# Altium integrated library CDxx.IntLib: 163 symbols (continued)
## 4082 (continued)

## 4085
designator U?
footprint DIL14-300
pins on every part: 7 VSS (power) hidden to VSS, 14 VDD (power) hidden to VDD
part A pins: 1 A (in), 2 B (in), 3 OUT (out), 10 INH (in), 12 C (in), 13 D (in)
part B pins: 4 OUT (out), 5 A (in), 6 B (in), 8 C (in), 9 D (in), 11 INH (in)

## 4085A
designator U?
footprint DIL14-300
pins on every part: 7 VSS (power) hidden to VSS, 14 VDD (power) hidden to VDD
part A pins: 1 (in), 2 (in), 3 (out), 10 (in), 12 (in), 13 (in)
part B pins: 4 (out), 5 (in), 6 (in), 8 (in), 9 (in), 11 (in)

## 4086
designator U?
footprint DIL14-300
pins: 1 A (in), 2 B (in), 3 J (out), 5 E (in), 6 F (in), 7 VSS (power) hidden to VSS, 8 G (in), 9 H (in), 10 I/~{E} (in), 11 EN/~{EX} (in), 12 C (in), 13 D (in), 14 VDD (power) hidden to VDD

## 4089
designator U?
footprint DIL16-300a
pins: 1 15 (out), 2 C (in), 3 D (in), 4 S15 (in), 5 OUT (out), 6 OUT (out), 7 INO (out), 8 VSS (power) hidden to VSS, 9 CLK (in), 10 ST (in), 11 INH (in), 12 CAS (in), 13 CL (in), 14 A (in), 15 B (in), 16 VDD (power) hidden to VDD

## 4093
designator U?
Price: 0.25
footprint DIL14-300
pins on every part: 7 VSS (power) hidden to VSS, 14 VDD (power) hidden to VDD
part A pins: 1 I0 (in), 2 I1 (in), 3 O (out)
part B pins: 4 O (out), 5 I0 (in), 6 I1 (in)
part C pins: 8 I0 (in), 9 I1 (in), 10 O (out)
part D pins: 11 O (out), 12 I0 (in), 13 I1 (in)
1 alternate drawing of the same symbol

## 4094
designator U?
footprint DIL16-300a
pins: 1 STR (in), 2 D (in), 3 CLK (in), 4 Q0 (out), 5 Q1 (out), 6 Q2 (out), 7 Q3 (out), 8 VSS (power) hidden to VSS, 9 QS (out), 10 ~{QS} (out), 11 Q7 (out), 12 Q6 (out), 13 Q5 (out), 14 Q4 (out), 15 OE (in), 16 VDD (power) hidden to VDD

## 4095
designator U?
footprint DIL14-300
pins: 2 R (in), 3 J1 (in), 4 J2 (in), 5 J3 (in), 6 ~{Q} (out), 7 VSS (power) hidden to VSS, 8 Q (out), 9 K3 (in), 10 K2 (in), 11 K1 (in), 12 CLK (in), 13 S (in), 14 VDD (power) hidden to VDD

## 4096
designator U?
footprint DIL14-300
pins: 2 R (in), 3 J1 (in), 4 J2 (in), 5 J3 (in), 6 ~{Q} (out), 7 VSS (power) hidden to VSS, 8 Q (out), 9 K3 (in), 10 K2 (in), 11 K1 (in), 12 CLK (in), 13 S (in), 14 VDD (power) hidden to VDD

## 4099
designator U?
footprint DIL16-300a
pins: 1 Q7 (out), 2 RST (in), 3 D (in), 4 WD (in), 5 A0 (in), 6 A1 (in), 7 A2 (in), 8 VSS (power) hidden to VSS, 9 Q0 (out), 10 Q1 (out), 11 Q2 (out), 12 Q3 (out), 13 Q4 (out), 14 Q5 (out), 15 Q6 (out), 16 VDD (power) hidden to VDD

## 4501
designator U?
footprint DIL16-300a
pins: 1 1A (in), 2 1B (in), 3 1C (in), 4 1D (in), 5 2A (in), 6 2B (in), 7 2C (in), 8 VSS (power) hidden to VSS, 9 2D (in), 10 2X (out), 11 E (in), 12 F (in), 13 1X (out), 14 Y (out), 15 ~{Y} (out), 16 VDD (power) hidden to VDD

## 4502
designator U?
footprint DIL16-300a
pins: 1 D3 (in), 2 Q3 (out), 3 D1 (in), 4 OD (in), 5 Q1 (out), 6 D2 (in), 7 Q2 (out), 8 Vss (power) hidden to Vss, 9 Q4 (out), 10 D4 (in), 11 Q5 (out), 12 INH (in), 13 D5 (in), 14 Q6 (out), 15 D6 (in), 16 Vdd (power) hidden to Vdd

## 4503
designator U?
footprint DIL16-300a
pins: 1 DA (in), 2 I1 (in), 3 O1 (out), 4 I2 (in), 5 O2 (out), 6 I3 (in), 7 O3 (out), 8 VSS (power) hidden to VSS, 9 O4 (out), 10 I4 (in), 11 O5 (out), 12 I5 (in), 13 O6 (out), 14 I6 (in), 15 DB (in), 16 VDD (power) hidden to VDD

## 4504
designator U?
footprint DIL16-300a
pins: 1 VCC (power) hidden to VCC, 2 AO (out), 3 AI (in), 4 BO (out), 5 BI (in), 6 CO (out), 7 CI (in), 8 VSS (power) hidden to VSS, 9 DI (in), 10 DO (out), 11 EI (in), 12 EO (out), 13 MODE (in), 14 FI (in), 15 FO (out), 16 VDD (power) hidden to VDD

## 4505
designator U?
footprint DIL14-300
pins: 1 A0 (in), 2 A1 (in), 3 A2 (in), 4 A3 (in), 5 ST (in), 6 CE1 (in), 7 VSS (power) hidden to VSS, 8 CE2 (in), 9 R/W (in), 10 DOut (out), 11 A4 (in), 12 A5 (in), 13 DIN (in), 14 VDD (power) hidden to VDD

## 4506
designator U?
footprint DIL16-300a
pins: 1 AA (in), 2 BA (in), 3 CA (in), 4 DA (in), 5 EA (in), 6 INH (in), 7 ZB (out), 8 VSS (power) hidden to VSS, 9 AB (in), 10 BB (in), 11 CB (in), 12 DB (in), 13 EB (in), 14 DIS (in), 15 ZA (out), 16 VDD (power) hidden to VDD

## 4508
designator U?
footprint DIL24-300a
pins on every part: 12 VSS (power) hidden to VSS, 24 VDD (power) hidden to VDD
part A pins: 1 MR (in), 2 ST (in), 3 DIS (in), 4 D0 (in), 5 Q0 (out), 6 D1 (in), 7 Q1 (out), 8 D2 (in), 9 Q2 (out), 10 D3 (in), 11 Q3 (out)
part B pins: 13 MR (in), 14 ST (in), 15 DIS (in), 16 D0 (in), 17 Q0 (out), 18 D1 (in), 19 Q1 (out), 20 D2 (in), 21 Q2 (out), 22 D3 (in), 23 Q3 (out)

## 4510
designator U?
Value: 4510
footprint DIL16-300a
pins: 1 L (in), 2 Q4 (out), 3 A4 (in), 4 A1 (in), 5 CI (in), 6 Q1 (out), 7 TC (out), 8 VSS (power) hidden to VSS, 9 R (in), 10 +/- (in), 11 Q2 (out), 12 A2 (in), 13 A3 (in), 14 Q3 (out), 15 CLK (in), 16 VDD (power) hidden to VDD

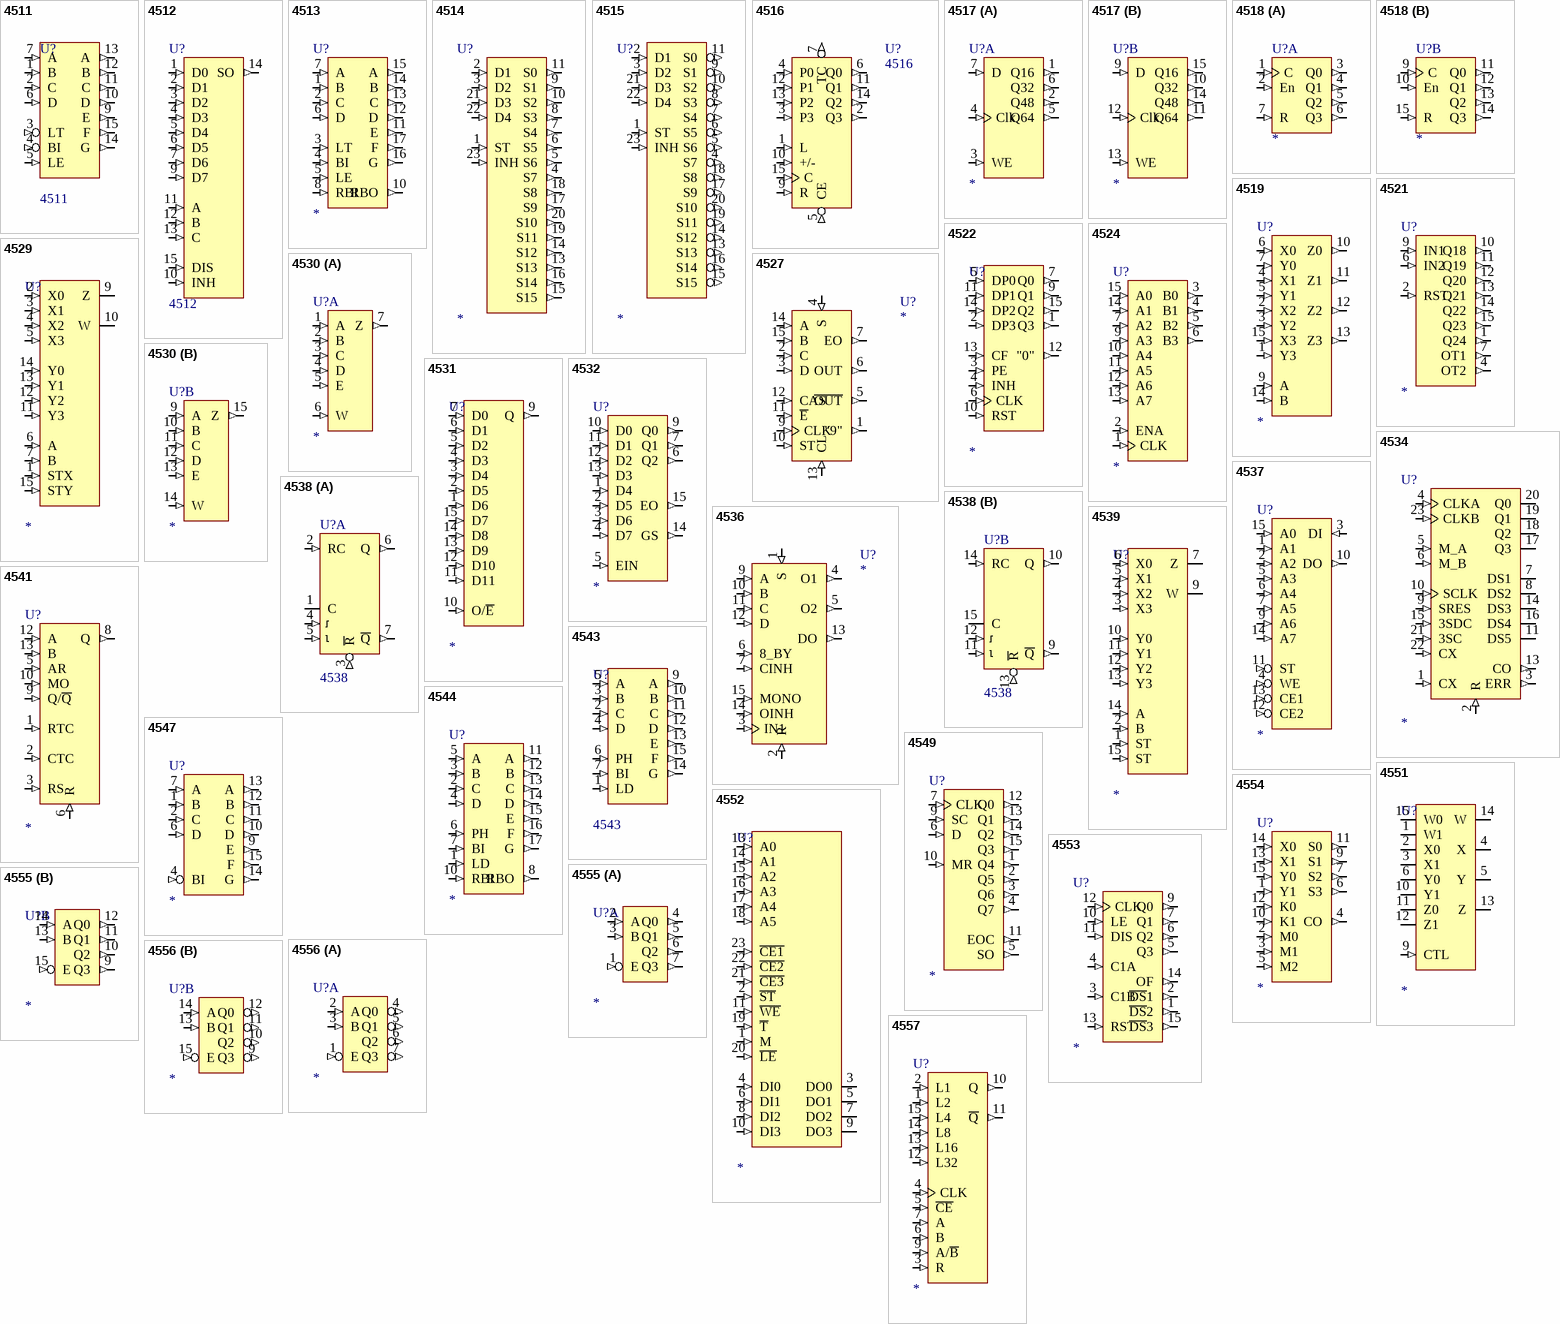
[diagram p4: symbols 4511 to 4557]

## 4511
designator U?
footprint DIL16-300a
pins: 1 B (in), 2 C (in), 3 LT (in), 4 BI (in), 5 LE (in), 6 D (in), 7 A (in), 8 Vss (power) hidden to Vss, 9 E (out), 10 D (out), 11 C (out), 12 B (out), 13 A (out), 14 G (out), 15 F (out), 16 Vdd (power) hidden to Vdd

## 4512
designator U?
footprint DIL16-300a
pins: 1 D0 (in), 2 D1 (in), 3 D2 (in), 4 D3 (in), 5 D4 (in), 6 D5 (in), 7 D6 (in), 8 VSS (power) hidden to VSS, 9 D7 (in), 10 INH (in), 11 A (in), 12 B (in), 13 C (in), 14 SO (out), 15 DIS (in), 16 VDD (power) hidden to VDD

## 4513
designator U?
footprint DIL18-300a
pins: 1 B (in), 2 C (in), 3 LT (in), 4 BI (in), 5 LE (in), 6 D (in), 7 A (in), 8 RBI (in), 9 VSS (power) hidden to VSS, 10 RBO (out), 11 E (out), 12 D (out), 13 C (out), 14 B (out), 15 A (out), 16 G (out), 17 F (out), 18 VDD (power) hidden to VDD

## 4514
designator U?
footprint DIL24-300a
pins: 1 ST (in), 2 D1 (in), 3 D2 (in), 4 S7 (out), 5 S6 (out), 6 S5 (out), 7 S4 (out), 8 S3 (out), 9 S1 (out), 10 S2 (out), 11 S0 (out), 12 VSS (power) hidden to VSS, 13 S13 (out), 14 S12 (out), 15 S15 (out), 16 S14 (out), 17 S9 (out), 18 S8 (out), 19 S11 (out), 20 S10 (out), 21 D3 (in), 22 D4 (in), 23 INH (in), 24 VDD (power) hidden to VDD

## 4515
designator U?
footprint DIL24-300a
pins: 1 ST (in), 2 D1 (in), 3 D2 (in), 4 S7 (out), 5 S6 (out), 6 S5 (out), 7 S4 (out), 8 S3 (out), 9 S1 (out), 10 S2 (out), 11 S0 (out), 12 VSS (power) hidden to VSS, 13 S13 (out), 14 S12 (out), 15 S15 (out), 16 S14 (out), 17 S9 (out), 18 S8 (out), 19 S11 (out), 20 S10 (out), 21 D3 (in), 22 D4 (in), 23 INH (in), 24 VDD (power) hidden to VDD

## 4516
designator U?
footprint DIL16-300a
pins: 1 L (in), 2 Q3 (out), 3 P3 (in), 4 P0 (in), 5 CE (in), 6 Q0 (out), 7 TC (out), 8 VSS (power) hidden to VSS, 9 R (in), 10 +/- (in), 11 Q1 (out), 12 P1 (in), 13 P2 (in), 14 Q2 (out), 15 C (in), 16 VDD (power) hidden to VDD
1 alternate drawing of the same symbol

## 4517
designator U?
footprint DIL16-300a
pins on every part: 8 VSS (power) hidden to VSS, 16 VDD (power) hidden to VDD
part A pins: 1 Q16 (out), 2 Q48 (out), 3 WE (in), 4 Clk (in), 5 Q64 (out), 6 Q32 (out), 7 D (in)
part B pins: 9 D (in), 10 Q32 (out), 11 Q64 (out), 12 Clk (in), 13 WE (in), 14 Q48 (out), 15 Q16 (out)

## 4518
designator U?
footprint DIL16-300a
pins on every part: 8 VSS (power) hidden to VSS, 16 VDD (power) hidden to VDD
part A pins: 1 C (in), 2 En (in), 3 Q0 (out), 4 Q1 (out), 5 Q2 (out), 6 Q3 (out), 7 R (in)
part B pins: 9 C (in), 10 En (in), 11 Q0 (out), 12 Q1 (out), 13 Q2 (out), 14 Q3 (out), 15 R (in)

## 4519
designator U?
footprint DIL16-300a
pins: 1 Y3 (in), 2 X2 (in), 3 Y2 (in), 4 X1 (in), 5 Y1 (in), 6 X0 (in), 7 Y0 (in), 8 VSS (power) hidden to VSS, 9 A (in), 10 Z0 (out), 11 Z1 (out), 12 Z2 (out), 13 Z3 (out), 14 B (in), 15 X3 (in), 16 VDD (power) hidden to VDD

## 4521
designator U?
footprint DIL16-300a
pins: 1 Q24 (out), 2 RST (in), 4 OT2 (out), 6 IN2 (in), 7 OT1 (out), 8 VSS (power) hidden to VSS, 9 IN1 (in), 10 Q18 (out), 11 Q19 (out), 12 Q20 (out), 13 Q21 (out), 14 Q22 (out), 15 Q23 (out), 16 VDD (power) hidden to VDD

## 4522
designator U?
footprint DIL16-300a
pins: 1 Q3 (out), 2 DP3 (in), 3 PE (in), 4 INH (in), 5 DP0 (in), 6 CLK (in), 7 Q0 (out), 8 VSS (power) hidden to VSS, 9 Q1 (out), 10 RST (in), 11 DP1 (in), 12 "0" (out), 13 CF (in), 14 DP2 (in), 15 Q2 (out), 16 VDD (power) hidden to VDD

## 4524
designator U?
footprint DIL16-300a
pins: 1 CLK (in), 2 ENA (in), 3 B0 (out), 4 B1 (out), 5 B2 (out), 6 B3 (out), 7 A2 (in), 8 VSS (power) hidden to VSS, 9 A3 (in), 10 A4 (in), 11 A5 (in), 12 A6 (in), 13 A7 (in), 14 A1 (in), 15 A0 (in), 16 VDD (power) hidden to VDD

## 4527
designator U?
footprint DIL16-300a
pins: 1 "9" (out), 2 C (in), 3 D (in), 4 S (in), 5 ~{OUT} (out), 6 OUT (out), 7 EO (out), 8 VSS (power) hidden to VSS, 9 CLK (in), 10 ST (in), 11 ~{E} (in), 12 CAS (in), 13 CL (in), 14 A (in), 15 B (in), 16 VDD (power) hidden to VDD

## 4529
designator U?
footprint DIL16-300a
pins: 1 STX (in), 2 X0 (in), 3 X1 (in), 4 X2 (in), 5 X3 (in), 6 A (in), 7 B (in), 8 VSS (power) hidden to VSS, 9 Z (hiz), 10 W (hiz), 11 Y3 (in), 12 Y2 (in), 13 Y1 (in), 14 Y0 (in), 15 STY (in), 16 VDD (power) hidden to VDD

## 4530
designator U?
footprint DIL16-300a
pins on every part: 8 VSS (power) hidden to VSS, 16 VDD (power) hidden to VDD
part A pins: 1 A (in), 2 B (in), 3 C (in), 4 D (in), 5 E (in), 6 W (in), 7 Z (out)
part B pins: 9 A (in), 10 B (in), 11 C (in), 12 D (in), 13 E (in), 14 W (in), 15 Z (out)

## 4531
designator U?
footprint DIL16-300a
pins: 1 D6 (in), 2 D5 (in), 3 D4 (in), 4 D3 (in), 5 D2 (in), 6 D1 (in), 7 D0 (in), 8 VSS (power) hidden to VSS, 9 Q (out), 10 O/~{E} (in), 11 D11 (in), 12 D10 (in), 13 D9 (in), 14 D8 (in), 15 D7 (in), 16 VDD (power) hidden to VDD

## 4532
designator U?
footprint DIL16-300a
pins: 1 D4 (in), 2 D5 (in), 3 D6 (in), 4 D7 (in), 5 EIN (in), 6 Q2 (out), 7 Q1 (out), 8 VSS (power) hidden to VSS, 9 Q0 (out), 10 D0 (in), 11 D1 (in), 12 D2 (in), 13 D3 (in), 14 GS (out), 15 EO (out), 16 VDD (power) hidden to VDD

## 4534
designator U?
footprint DIL24-300a
pins: 1 CX (in), 2 R (in), 3 ERR (out), 4 CLKA (in), 5 M_A (in), 6 M_B (in), 7 DS1 (hiz), 8 DS2 (hiz), 9 SRES (in), 10 SCLK (in), 11 DS5 (hiz), 12 VSS (power) hidden to VSS, 13 CO (out), 14 DS3 (hiz), 15 3SDC (in), 16 DS4 (hiz), 17 Q3 (hiz), 18 Q2 (hiz), 19 Q1 (hiz), 20 Q0 (hiz), 21 3SC (in), 22 CX (in), 23 CLKB (in), 24 VDD (power) hidden to VDD

## 4536
designator U?
footprint DIL16-300a
pins: 1 S (in), 2 R (in), 3 IN1 (in), 4 O1 (out), 5 O2 (out), 6 8_BY (in), 7 CINH (in), 8 VSS (power) hidden to VSS, 9 A (in), 10 B (in), 11 C (in), 12 D (in), 13 DO (out), 14 OINH (in), 15 MONO (in), 16 VDD (power) hidden to VDD

## 4537
designator U?
footprint DIL16-300a
pins: 1 A1 (in), 2 A2 (in), 3 DI (in), 4 WE (in), 5 A3 (in), 6 A4 (in), 7 A5 (in), 8 VSS (power) hidden to VSS, 9 A6 (in), 10 DO (out), 11 ST (in), 12 CE2 (in), 13 CE1 (in), 14 A7 (in), 15 A0 (in), 16 VDD (power) hidden to VDD

## 4538
designator U?
Price: 0.4; Value: 4538
footprint DIL16-300a
footprint SO16-150
pins on every part: 8 VSS (power) hidden to VSS, 16 VDD (power) hidden to VDD
part A pins: 1 C, 2 RC (in), 3 ~{R} (in), 4 +T (in), 5 -T (in), 6 Q (out), 7 ~{Q} (out)
part B pins: 9 ~{Q} (out), 10 Q (out), 11 -T (in), 12 +T (in), 13 ~{R} (in), 14 RC (in), 15 C

## 4539
designator U?
footprint DIL16-300a
pins: 1 ST (in), 2 B (in), 3 X3 (in), 4 X2 (in), 5 X1 (in), 6 X0 (in), 7 Z (hiz), 8 VSS (power) hidden to VSS, 9 W (hiz), 10 Y0 (in), 11 Y1 (in), 12 Y2 (in), 13 Y3 (in), 14 A (in), 15 ST (in), 16 VDD (power) hidden to VDD

## 4541
designator U?
footprint DIL14-300
pins: 1 RTC (in), 2 CTC (in), 3 RS (in), 5 AR (in), 6 R (in), 7 VSS (power) hidden to VSS, 8 Q (out), 9 Q/~{Q} (in), 10 MO (in), 12 A (in), 13 B (in), 14 VDD (power) hidden to VDD

## 4543
designator U?
Price: 0.45; Value: 4543
footprint DIL16-300a
pins: 1 LD (in), 2 C (in), 3 B (in), 4 D (in), 5 A (in), 6 PH (in), 7 BI (in), 8 VSS (power) hidden to VSS, 9 A (out), 10 B (out), 11 C (out), 12 D (out), 13 E (out), 14 G (out), 15 F (out), 16 VDD (power) hidden to VDD

## 4544
designator U?
footprint DIL18-300a
pins: 1 LD (in), 2 C (in), 3 B (in), 4 D (in), 5 A (in), 6 PH (in), 7 BI (in), 8 RBO (out), 9 VSS (power) hidden to VSS, 10 RBI (in), 11 A (out), 12 B (out), 13 C (out), 14 D (out), 15 E (out), 16 F (out), 17 G (out), 18 VDD (power) hidden to VDD

## 4547
designator U?
footprint DIL16-300a
pins: 1 B (in), 2 C (in), 4 BI (in), 6 D (in), 7 A (in), 8 VSS (power) hidden to VSS, 9 E (out), 10 D (out), 11 C (out), 12 B (out), 13 A (out), 14 G (out), 15 F (out), 16 VDD (power) hidden to VDD

## 4549
designator U?
footprint DIL16-300a
pins: 1 Q4 (out), 2 Q5 (out), 3 Q6 (out), 4 Q7 (out), 5 SO (out), 6 D (in), 7 CLK (in), 8 VSS (power) hidden to VSS, 9 SC (in), 10 MR (in), 11 EOC (out), 12 Q0 (out), 13 Q1 (out), 14 Q2 (out), 15 Q3 (out), 16 VDD (power) hidden to VDD

## 4551
designator U?
footprint DIL16-300a
pins: 1 W1 (io), 2 X0 (io), 3 X1 (io), 4 X (io), 5 Y (io), 6 Y0 (io), 7 VEE (power) hidden to VEE, 8 VSS (power) hidden to VSS, 9 CTL (in), 10 Y1 (io), 11 Z0 (io), 12 Z1 (io), 13 Z (io), 14 W (io), 15 W0 (io), 16 VDD (power) hidden to VDD

## 4552
designator U?
footprint DIL24-300a
pins: 1 M (in), 2 ~{ST} (in), 3 DO0 (hiz), 4 DI0 (in), 5 DO1 (hiz), 6 DI1 (in), 7 DO2 (hiz), 8 DI2 (in), 9 DO3 (hiz), 10 DI3 (in), 11 ~{WE} (in), 12 VSS (power) hidden to VSS, 13 A0 (in), 14 A1 (in), 15 A2 (in), 16 A3 (in), 17 A4 (in), 18 A5 (in), 19 ~{T} (in), 20 ~{LE} (in), 21 ~{CE3} (in), 22 ~{CE2} (in), 23 ~{CE1} (in), 24 VDD (power) hidden to VDD

## 4553
designator U?
footprint DIL16-300a
pins: 1 ~{DS}2 (out), 2 ~{DS}1 (out), 3 C1B (in), 4 C1A (in), 5 Q3 (out), 6 Q2 (out), 7 Q1 (out), 8 VSS (power) hidden to VSS, 9 Q0 (out), 10 LE (in), 11 DIS (in), 12 CLK (in), 13 RST (in), 14 OF (out), 15 ~{DS}3 (out), 16 VDD (power) hidden to VDD

## 4554
designator U?
footprint DIL16-300a
pins: 1 Y1 (in), 2 M0 (in), 3 M1 (in), 4 CO (out), 5 M2 (in), 6 S3 (out), 7 S2 (out), 8 VSS (power) hidden to VSS, 9 S1 (out), 10 K1 (in), 11 S0 (out), 12 K0 (in), 13 X1 (in), 14 X0 (in), 15 Y0 (in), 16 VDD (power) hidden to VDD

## 4555
designator U?
footprint DIL16-300a
pins on every part: 8 VSS (power) hidden to VSS, 16 VDD (power) hidden to VDD
part A pins: 1 E (in), 2 A (in), 3 B (in), 4 Q0 (out), 5 Q1 (out), 6 Q2 (out), 7 Q3 (out)
part B pins: 9 Q3 (out), 10 Q2 (out), 11 Q1 (out), 12 Q0 (out), 13 B (in), 14 A (in), 15 E (in)

## 4556
designator U?
footprint DIL16-300a
pins on every part: 8 VSS (power) hidden to VSS, 16 VDD (power) hidden to VDD
part A pins: 1 E (in), 2 A (in), 3 B (in), 4 Q0 (out), 5 Q1 (out), 6 Q2 (out), 7 Q3 (out)
part B pins: 9 Q3 (out), 10 Q2 (out), 11 Q1 (out), 12 Q0 (out), 13 B (in), 14 A (in), 15 E (in)

## 4557
designator U?
footprint DIL16-300a
pins: 1 L2 (in), 2 L1 (in), 3 R (in), 4 CLK (in), 5 ~{CE} (in), 6 B (in), 7 A (in), 8 VSS (power) hidden to VSS, 9 A/~{B} (in), 10 Q (out), 11 ~{Q} (out), 12 L32 (in), 13 L16 (in), 14 L8 (in), 15 L4 (in), 16 VDD (power) hidden to VDD

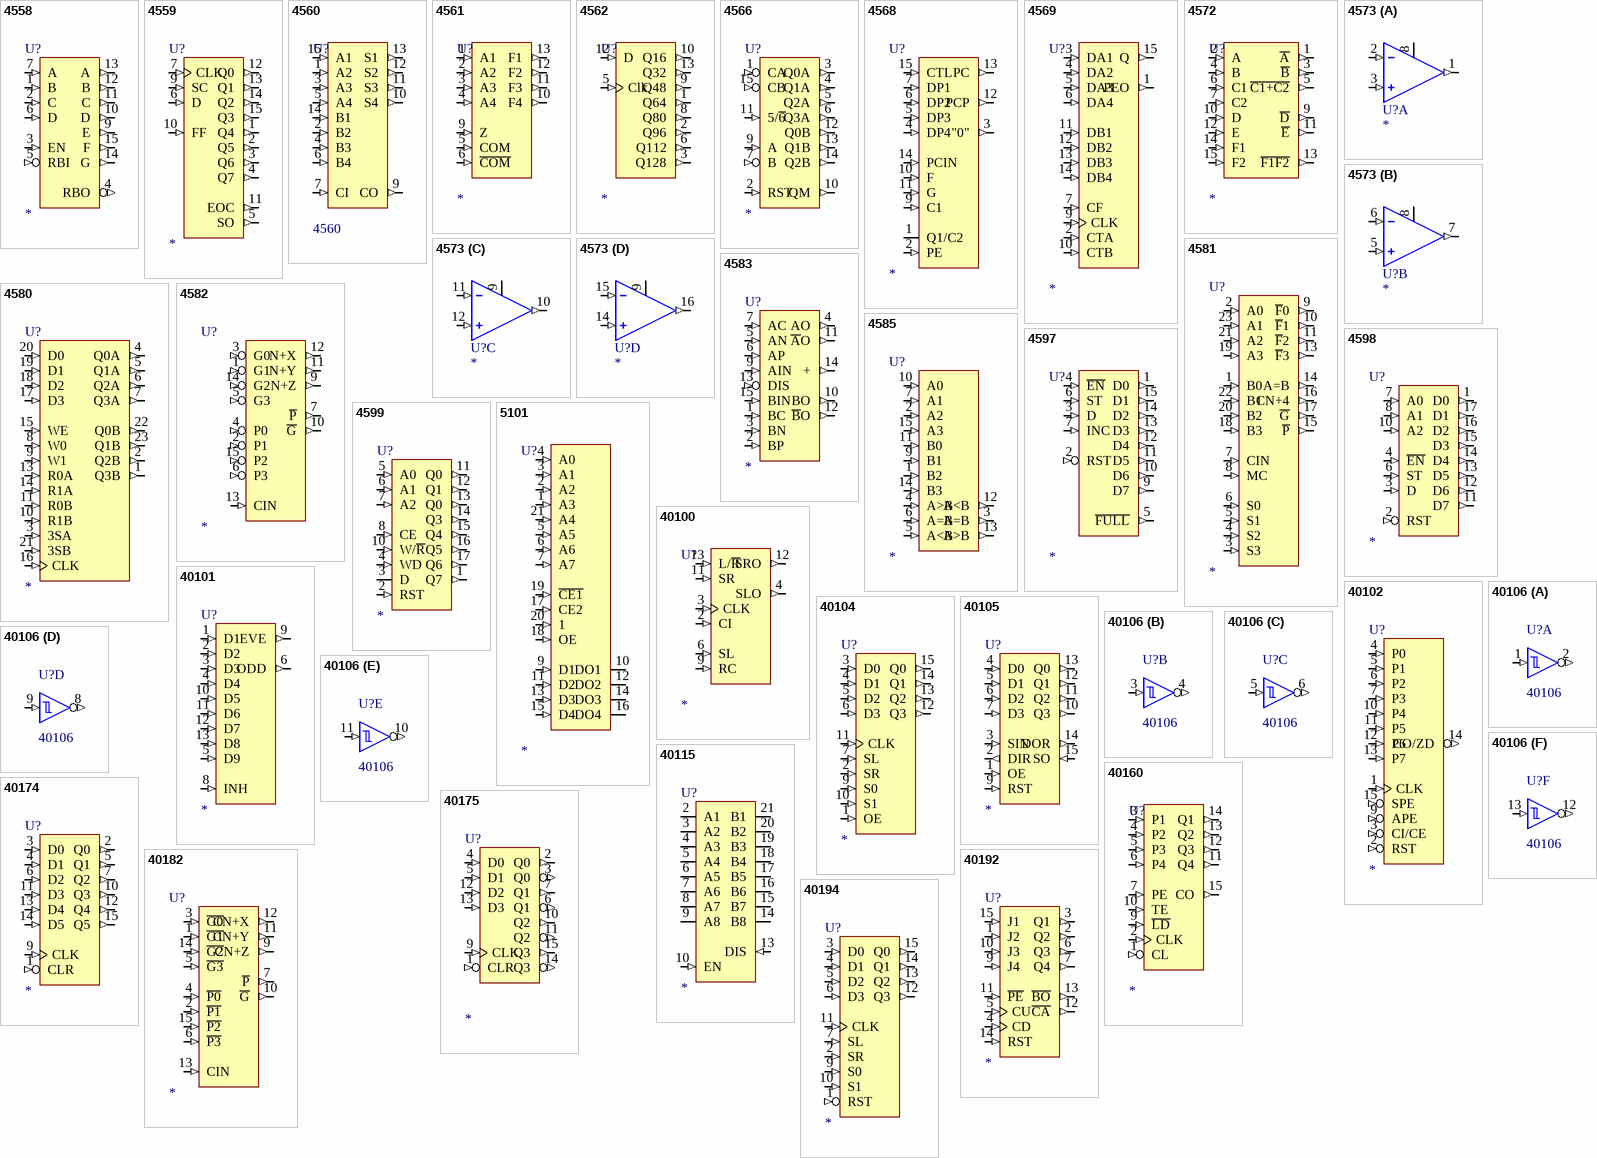
[diagram p5: symbols 4558 to 40194]

## 4558
designator U?
footprint DIL16-300a
pins: 1 B (in), 2 C (in), 3 EN (in), 4 RBO (out), 5 RBI (in), 6 D (in), 7 A (in), 8 VSS (power) hidden to VSS, 9 E (out), 10 D (out), 11 C (out), 12 B (out), 13 A (out), 14 G (out), 15 F (out), 16 VDD (power) hidden to VDD

## 4559
designator U?
footprint DIL16-300a
pins: 1 Q4 (out), 2 Q5 (out), 3 Q6 (out), 4 Q7 (out), 5 SO (out), 6 D (in), 7 CLK (in), 8 VSS (power) hidden to VSS, 9 SC (in), 10 FF (in), 11 EOC (out), 12 Q0 (out), 13 Q1 (out), 14 Q2 (out), 15 Q3 (out), 16 VDD (power) hidden to VDD

## 4560
designator U?
footprint DIL16-300a
pins: 1 A2 (in), 2 B2 (in), 3 A3 (in), 4 B3 (in), 5 A4 (in), 6 B4 (in), 7 CI (in), 8 VSS (power) hidden to VSS, 9 CO (out), 10 S4 (out), 11 S3 (out), 12 S2 (out), 13 S1 (out), 14 B1 (in), 15 A1 (in), 16 VDD (power) hidden to VDD

## 4561
designator U?
footprint DIL14-300
pins: 1 A1 (in), 2 A2 (in), 3 A3 (in), 4 A4 (in), 5 COM (in), 6 ~{COM} (in), 7 VSS (power) hidden to VSS, 9 Z (in), 10 F4 (out), 11 F3 (out), 12 F2 (out), 13 F1 (out), 14 VDD (power) hidden to VDD

## 4562
designator U?
footprint DIL14-300
pins: 1 Q64 (out), 2 Q96 (out), 3 Q128 (out), 5 Clk (in), 6 Q112 (out), 7 VSS (power) hidden to VSS, 8 Q80 (out), 9 Q48 (out), 10 Q16 (out), 12 D (in), 13 Q32 (out), 14 VDD (power) hidden to VDD

## 4566
designator U?
footprint DIL16-300a
pins: 1 CA (in), 2 RST (in), 3 Q0A (out), 4 Q1A (out), 5 Q2A (out), 6 Q3A (out), 7 B (in), 8 VSS (power) hidden to VSS, 9 A (in), 10 QM (out), 11 5/~{6} (in), 12 Q0B (out), 13 Q1B (out), 14 Q2B (out), 15 CB (in), 16 VDD (power) hidden to VDD

## 4568
designator U?
footprint DIL16-300a
pins: 1 Q1/C2 (io), 2 PE (in), 3 "0" (out), 4 DP4 (in), 5 DP3 (in), 6 DP2 (in), 7 DP1 (in), 8 VSS (power) hidden to VSS, 9 C1 (in), 10 F (in), 11 G (in), 12 PCP (out), 13 PC (out), 14 PCIN (in), 15 CTL (in), 16 VDD (power) hidden to VDD

## 4569
designator U?
footprint DIL16-300a
pins: 1 PEO (out), 2 CTA (in), 3 DA1 (in), 4 DA2 (in), 5 DA3 (in), 6 DA4 (in), 7 CF (in), 8 VSS (power) hidden to VSS, 9 CLK (in), 10 CTB (in), 11 DB1 (in), 12 DB2 (in), 13 DB3 (in), 14 DB4 (in), 15 Q (out), 16 VDD (power) hidden to VDD

## 4572
designator U?
footprint DIL16-300a
pins: 1 ~{A} (out), 2 A (in), 3 ~{B} (out), 4 B (in), 5 ~{C1+C2} (out), 6 C1 (in), 7 C2 (in), 8 VSS (power) hidden to VSS, 9 ~{D} (out), 10 D (in), 11 ~{E} (out), 12 E (in), 13 ~{F1F2} (out), 14 F1 (in), 15 F2 (in), 16 VDD (power) hidden to VDD

## 4573
designator U?
footprint DIL16-300a
pins on every part: 4 VCC (power) hidden to VCC, 13 VEE (power) hidden to VEE
part A pins: 1 O (out), 2 - (in), 3 + (in), 8 Is
part B pins: 5 + (in), 6 - (in), 7 O (out), 8 Is
part C pins: 9 Is, 10 O (out), 11 - (in), 12 + (in)
part D pins: 9 Is, 14 + (in), 15 - (in), 16 O (out)

## 4580
designator U?
footprint DIL24-300a
pins: 1 Q3B (out), 2 Q2B (out), 3 3SA (in), 4 Q0A (out), 5 Q1A (out), 6 Q2A (out), 7 Q3A (out), 8 W0 (in), 9 W1 (in), 10 R1B (in), 11 R0B (in), 12 VSS (power) hidden to VSS, 13 R0A (in), 14 R1A (in), 15 WE (in), 16 CLK (in), 17 D3 (in), 18 D2 (in), 19 D1 (in), 20 D0 (in), 21 3SB (in), 22 Q0B (out), 23 Q1B (out), 24 VDD (power) hidden to VDD

## 4581
designator U?
footprint DIL24-300a
pins: 1 B0 (in), 2 A0 (in), 3 S3 (in), 4 S2 (in), 5 S1 (in), 6 S0 (in), 7 CIN (in), 8 MC (in), 9 ~{F}0 (out), 10 ~{F}1 (out), 11 ~{F}2 (out), 12 VSS (power) hidden to VSS, 13 ~{F}3 (out), 14 A=B (out), 15 ~{P} (out), 16 CN+4 (out), 17 ~{G} (out), 18 B3 (in), 19 A3 (in), 20 B2 (in), 21 A2 (in), 22 B1 (in), 23 A1 (in), 24 VDD (power) hidden to VDD

## 4582
designator U?
footprint DIL16-300a
pins: 1 G1 (in), 2 P1 (in), 3 G0 (in), 4 P0 (in), 5 G3 (in), 6 P3 (in), 7 ~{P} (out), 8 VSS (power) hidden to VSS, 9 N+Z (out), 10 ~{G} (out), 11 N+Y (out), 12 N+X (out), 13 CIN (in), 14 G2 (in), 15 P2 (in), 16 VDD (power) hidden to VDD

## 4583
designator U?
footprint DIL16-300a
pins: 1 BC (in), 2 BP (in), 3 BN (in), 4 AO (out), 5 AN (in), 6 AP (in), 7 AC (in), 8 VSS (power) hidden to VSS, 9 AIN (in), 10 BO (out), 11 ~{A}O (out), 12 ~{B}O (out), 13 DIS (in), 14 + (out), 15 BIN (in), 16 VDD (power) hidden to VDD

## 4585
designator U?
footprint DIL16-300a
pins: 1 B2 (in), 2 A2 (in), 3 A=B (out), 4 A>B (in), 5 A<B (in), 6 A=B (in), 7 A1 (in), 8 VSS (power) hidden to VSS, 9 B1 (in), 10 A0 (in), 11 B0 (in), 12 A<B (out), 13 A>B (out), 14 B3 (in), 15 A3 (in), 16 VDD (power) hidden to VDD

## 4597
designator U?
footprint DIL16-300a
pins: 1 D0 (out), 2 RST (in), 3 D (in), 4 ~{EN} (in), 5 ~{FULL} (out), 6 ST (in), 7 INC (in), 8 VSS (power) hidden to VSS, 9 D7 (out), 10 D6 (out), 11 D5 (out), 12 D4 (out), 13 D3 (out), 14 D2 (out), 15 D1 (out), 16 VDD (power) hidden to VDD

## 4598
designator U?
footprint DIL18-300a
pins: 1 D0 (out), 2 RST (in), 3 D (in), 4 ~{EN} (in), 6 ST (in), 7 A0 (in), 8 A1 (in), 9 VSS (power) hidden to VSS, 10 A2 (in), 11 D7 (out), 12 D6 (out), 13 D5 (out), 14 D4 (out), 15 D3 (out), 16 D2 (out), 17 D1 (out), 18 VDD (power) hidden to VDD

## 4599
designator U?
footprint DIL18-300a
pins: 1 Q7 (out), 2 RST (in), 3 D (io), 4 WD (in), 5 A0 (in), 6 A1 (in), 7 A2 (in), 8 CE (in), 9 VSS (power) hidden to VSS, 10 W/~{R} (in), 11 Q0 (out), 12 Q1 (out), 13 Q0 (out), 14 Q3 (out), 15 Q4 (out), 16 Q5 (out), 17 Q6 (out), 18 VDD (power) hidden to VDD

## 5101
designator U?
footprint DIL22-300a
pins: 1 A3 (in), 2 A2 (in), 3 A1 (in), 4 A0 (in), 5 A5 (in), 6 A6 (in), 7 A7 (in), 8 GND (power) hidden to GND, 9 D1 (in), 10 DO1 (hiz), 11 D2 (in), 12 DO2 (hiz), 13 D3 (in), 14 DO3 (hiz), 15 D4 (in), 16 DO4 (hiz), 17 CE2 (in), 18 OE (in), 19 ~{CE1} (in), 20 1 (in), 21 A4 (in), 22 VCC (power) hidden to VCC

## 40100
designator U?
footprint DIL16-300a
pins: 2 CI (in), 3 CLK (in), 4 SLO (out), 6 SL (in), 8 VSS (power) hidden to VSS, 9 RC (in), 11 SR (in), 12 SRO (out), 13 L/~{R} (in), 16 VDD (power) hidden to VDD

## 40101
designator U?
footprint DIL14-300
pins: 1 D1 (in), 2 D2 (in), 3 D3 (in), 4 D4 (in), 5 D9 (in), 6 ODD (out), 7 VSS (power) hidden to VSS, 8 INH (in), 9 EVE (out), 10 D5 (in), 11 D6 (in), 12 D7 (in), 13 D8 (in), 14 VDD (power) hidden to VDD

## 40102
designator U?
footprint DIL16-300a
pins: 1 CLK (in), 2 RST (in), 3 CI/CE (in), 4 P0 (in), 5 P1 (in), 6 P2 (in), 7 P3 (in), 8 VSS (power) hidden to VSS, 9 APE (in), 10 P4 (in), 11 P5 (in), 12 P6 (in), 13 P7 (in), 14 CO/ZD (out), 15 SPE (in), 16 VDD (power) hidden to VDD

## 40104
designator U?
footprint DIL16-300a
pins: 1 OE (in), 2 SR (in), 3 D0 (in), 4 D1 (in), 5 D2 (in), 6 D3 (in), 7 SL (in), 8 VSS (power) hidden to VSS, 9 S0 (in), 10 S1 (in), 11 CLK (in), 12 Q3 (out), 13 Q2 (out), 14 Q1 (out), 15 Q0 (out), 16 VDD (power) hidden to VDD

## 40105
designator U?
footprint DIL16-300a
pins: 1 OE (in), 2 DIR (out), 3 SIN (in), 4 D0 (in), 5 D1 (in), 6 D2 (in), 7 D3 (in), 8 VSS (power) hidden to VSS, 9 RST (in), 10 Q3 (out), 11 Q2 (out), 12 Q1 (out), 13 Q0 (out), 14 DOR (out), 15 SO (in), 16 VDD (power) hidden to VDD

## 40106
designator U?
Price: 0.24; Value: 40106
footprint DIL14-300
footprint SO14-150
pins on every part: 7 VSS (power) hidden to VSS, 14 VDD (power) hidden to VDD
part A pins: 1 I (in), 2 O (out)
part B pins: 3 I (in), 4 O (out)
part C pins: 5 I (in), 6 O (out)
part D pins: 8 O (out), 9 I (in)
part E pins: 10 O (out), 11 I (in)
part F pins: 12 O (out), 13 I (in)
1 alternate drawing of the same symbol

## 40115
designator U?
footprint DIL22-300a
pins: 1 VDD (power) hidden to VDD, 2 A1 (io), 3 A2 (io), 4 A3 (io), 5 A4 (io), 6 A5 (io), 7 A6 (io), 8 A7 (io), 9 A8 (io), 10 EN (in), 11 VSS (power) hidden to VSS, 12 VSS (power) hidden to VSS, 13 DIS (in), 14 B8 (io), 15 B7 (io), 16 B6 (io), 17 B5 (io), 18 B4 (io), 19 B3 (io), 20 B2 (io), 21 B1 (io), 22 VCC (power) hidden to VCC

## 40160
designator U?
footprint DIL16-300a
pins: 1 CL (in), 2 CLK (in), 3 P1 (in), 4 P2 (in), 5 P3 (in), 6 P4 (in), 7 PE (in), 8 VSS (power) hidden to VSS, 9 ~{LD} (in), 10 TE (in), 11 Q4 (out), 12 Q3 (out), 13 Q2 (out), 14 Q1 (out), 15 CO (out), 16 VDD (power) hidden to VDD

## 40174
designator U?
footprint DIL16-300a
pins: 1 CLR (in), 2 Q0 (out), 3 D0 (in), 4 D1 (in), 5 Q1 (out), 6 D2 (in), 7 Q2 (out), 8 VSS (power) hidden to VSS, 9 CLK (in), 10 Q3 (out), 11 D3 (in), 12 Q4 (out), 13 D4 (in), 14 D5 (in), 15 Q5 (out), 16 VDD (power) hidden to VDD

## 40175
designator U?
footprint DIL16-300a
pins: 1 CLR (in), 2 Q0 (out), 3 Q0 (out), 4 D0 (in), 5 D1 (in), 6 Q1 (out), 7 Q1 (out), 8 VSS (power) hidden to VSS, 9 CLK (in), 10 Q2 (out), 11 Q2 (out), 12 D2 (in), 13 D3 (in), 14 Q3 (out), 15 Q3 (out), 16 VDD (power) hidden to VDD

## 40182
designator U?
footprint DIL16-300a
pins: 1 ~{G1} (in), 2 ~{P1} (in), 3 ~{G0} (in), 4 ~{P0} (in), 5 ~{G3} (in), 6 ~{P3} (in), 7 ~{P} (out), 8 VSS (power) hidden to VSS, 9 CN+Z (out), 10 ~{G} (out), 11 CN+Y (out), 12 CN+X (out), 13 CIN (in), 14 ~{G2} (in), 15 ~{P2} (in), 16 VDD (power) hidden to VDD

## 40192
designator U?
footprint DIL16-300a
pins: 1 J2 (in), 2 Q2 (out), 3 Q1 (out), 4 CD (in), 5 CU (in), 6 Q3 (out), 7 Q4 (out), 8 VSS (power) hidden to VSS, 9 J4 (in), 10 J3 (in), 11 ~{PE} (in), 12 ~{CA} (out), 13 ~{BO} (out), 14 RST (in), 15 J1 (in), 16 VDD (power) hidden to VDD

## 40194
designator U?
footprint DIL16-300a
pins: 1 RST (in), 2 SR (in), 3 D0 (in), 4 D1 (in), 5 D2 (in), 6 D3 (in), 7 SL (in), 8 VSS (power) hidden to VSS, 9 S0 (in), 10 S1 (in), 11 CLK (in), 12 Q3 (out), 13 Q2 (out), 14 Q1 (out), 15 Q0 (out), 16 VDD (power) hidden to VDD

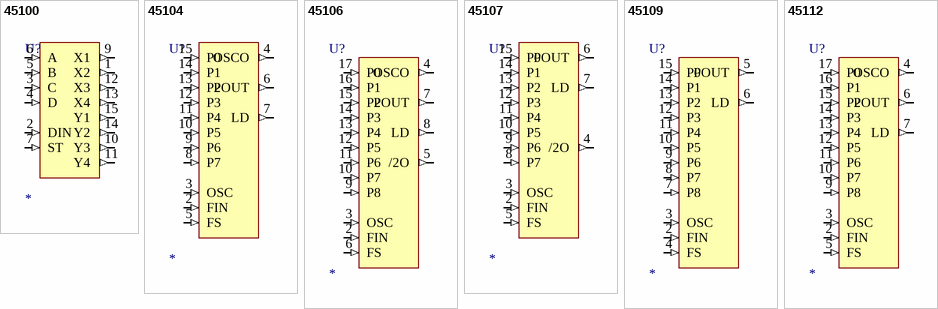
[diagram p6: symbols 45100 to 45112]

## 45100
designator U?
footprint DIL16-300a
pins: 1 X2 (out), 2 DIN (in), 3 C (in), 4 D (in), 5 B (in), 6 A (in), 7 ST (in), 8 VSS (power) hidden to VSS, 9 X1 (out), 10 Y3 (out), 11 Y4 (out), 12 X3 (out), 13 X4 (out), 14 Y2 (out), 15 Y1 (out), 16 VDD (power) hidden to VDD

## 45104
designator U?
footprint DIL16-300a
pins: 1 VDD (power) hidden to VDD, 2 FIN (in), 3 OSC (in), 4 OSCO (out), 5 FS (in), 6 POUT (out), 7 LD (out), 8 P7 (in), 9 P6 (in), 10 P5 (in), 11 P4 (in), 12 P3 (in), 13 P2 (in), 14 P1 (in), 15 P0 (in), 16 VSS (power) hidden to VSS

## 45106
designator U?
footprint DIL18-300a
pins: 1 VDD (power) hidden to VDD, 2 FIN (in), 3 OSC (in), 4 OSCO (out), 5 /2O (out), 6 FS (in), 7 POUT (out), 8 LD (out), 9 P8 (in), 10 P7 (in), 11 P6 (in), 12 P5 (in), 13 P4 (in), 14 P3 (in), 15 P2 (in), 16 P1 (in), 17 P0 (in), 18 VSS (power) hidden to VSS

## 45107
designator U?
footprint DIL16-300a
pins: 1 VDD (power) hidden to VDD, 2 FIN (in), 3 OSC (in), 4 /2O (out), 5 FS (in), 6 POUT (out), 7 LD (out), 8 P7 (in), 9 P6 (in), 10 P5 (in), 11 P4 (in), 12 P3 (in), 13 P2 (in), 14 P1 (in), 15 P0 (in), 16 VSS (power) hidden to VSS

## 45109
designator U?
footprint DIL16-300a
pins: 1 VDD (power) hidden to VDD, 2 FIN (in), 3 OSC (in), 4 FS (in), 5 POUT (out), 6 LD (out), 7 P8 (in), 8 P7 (in), 9 P6 (in), 10 P5 (in), 11 P4 (in), 12 P3 (in), 13 P2 (in), 14 P1 (in), 15 P0 (in), 16 VSS (power) hidden to VSS

## 45112
designator U?
footprint DIL18-300a
pins: 1 VDD (power) hidden to VDD, 2 FIN (in), 3 OSC (in), 4 OSCO (out), 5 FS (in), 6 POUT (out), 7 LD (out), 9 P8 (in), 10 P7 (in), 11 P6 (in), 12 P5 (in), 13 P4 (in), 14 P3 (in), 15 P2 (in), 16 P1 (in), 17 P0 (in), 18 VSS (power) hidden to VSS